# Altium footprint library My Library.PcbLib: 872 footprints (part 54 of 55)
Each footprint in its own frame and in the unit in brackets; x right, y up, seen from the top. Pads: shape width x height; smd on the part's side, far side on the other; paste and mask are expansions set on the pad; w line width, h text height; cw(c..) or ccw(c..) is an arc to the next point about the centre after c.
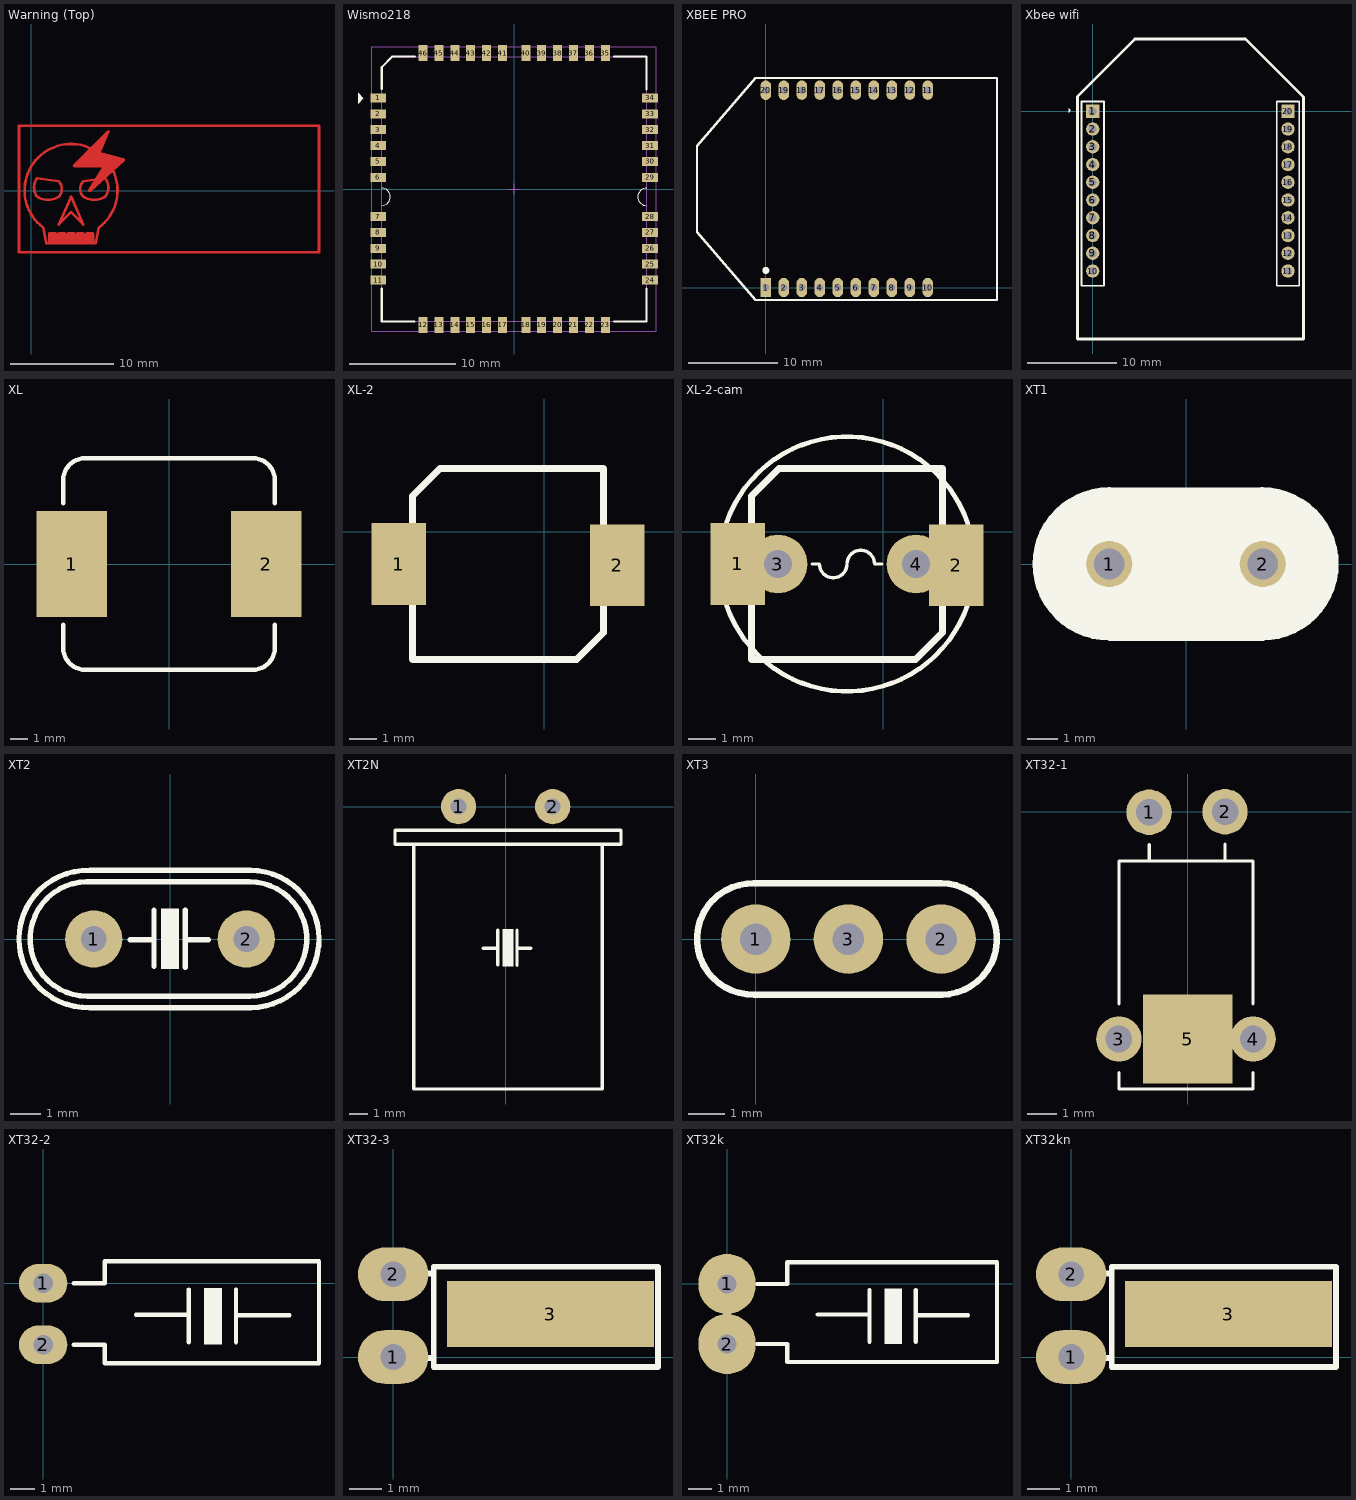
[diagram p53: the footprints below, top view; thin cyan lines are the x and y axes]

## Warning (Top) [mm]
Top Layer:
  region: 4.253,-4.105 4.293,-4.202 4.293,-5.102 4.253,-5.2 4.156,-5.24 3.556,-5.24 3.459,-5.2 3.419,-5.102 3.419,-4.202 3.459,-4.105 3.556,-4.065 4.156,-4.065
  region: 3.353,-4.105 3.393,-4.202 3.393,-5.102 3.353,-5.2 3.255,-5.24 2.655,-5.24 2.558,-5.2 2.518,-5.102 2.518,-4.202 2.558,-4.105 2.655,-4.065 3.255,-4.065
  region: 6.054,-4.105 6.094,-4.202 6.094,-5.102 6.054,-5.2 5.957,-5.24 5.356,-5.24 5.259,-5.2 5.219,-5.102 5.219,-4.202 5.259,-4.105 5.356,-4.065 5.957,-4.065
  region: 5.153,-4.105 5.194,-4.202 5.194,-5.102 5.153,-5.2 5.056,-5.24 4.456,-5.24 4.359,-5.2 4.319,-5.102 4.319,-4.202 4.359,-4.105 4.456,-4.065 5.056,-4.065
  region: 2.452,-4.105 2.492,-4.202 2.492,-5.102 2.452,-5.2 2.355,-5.24 1.755,-5.24 1.658,-5.2 1.617,-5.102 1.617,-4.202 1.658,-4.105 1.755,-4.065 2.355,-4.065
  region: 7.483,5.829 7.512,5.829 7.53,5.81 7.555,5.8 7.565,5.774 7.585,5.754 7.585,5.727 7.595,5.703 7.584,5.677 7.584,5.649 6.747,3.696 8.991,3.135 9.024,3.111 9.06,3.094 9.065,3.081 9.076,3.073 9.082,3.033 9.095,2.995 9.089,2.983 9.092,2.969 9.068,2.936 9.051,2.9 5.749,-0.102 5.716,-0.114 5.687,-0.134 5.668,-0.131 5.65,-0.137 5.618,-0.122 5.584,-0.117 5.572,-0.101 5.555,-0.092 5.543,-0.059 5.523,-0.031 5.526,-0.012 5.519,0.007 5.534,0.038 5.54,0.073 6.909,2.264 4.156,2.264 4.059,2.304 4.018,2.401 4.059,2.498 7.36,5.8 7.386,5.811 7.406,5.83 7.433,5.83 7.457,5.84
  lines w0.254: -1.201,-6.003 -1.201,6.303 27.94,6.303 27.94,-6.003 -1.201,-6.003 ; 0.554,-0.6 ccw(c1.604,1.05) 2.655,-0.6 ccw(c1.905,0.15) 2.655,0.9 0.554,1.201 ccw(c1.755,0.3) 0.554,-0.6 ; 1.154,-3.602 cw(c3.856,0.014) 6.557,-3.602 6.257,-5.102 1.455,-5.102 1.154,-3.602 ; 2.655,-3.302 3.856,-0.6 5.056,-3.302 3.856,-2.101 2.655,-3.302 ; 4.156,2.401 7.457,5.703 6.557,3.602 8.958,3.002 5.657,0 7.157,2.401 4.156,2.401 ; 5.056,-0.6 cw(c5.806,0.15) 5.056,0.9 7.157,1.201 cw(c6.107,0.3) 7.157,-0.6 cw(c6.107,1.05) 5.056,-0.6
  text "NGUY HIÓM" at 9.271,1.524 h4
  text "§iÖn ¸p cao" at 11.303,-2.921 h3

## Wismo218 [mm] "LCC, 46-Pins, Body 25,0x25,0mm (max), Wismo218"
height 2.8
pads (46):
  rect 1.5x0.85 smd: 1(-12.825,8.6) 2(-12.825,7.1) 3(-12.825,5.6) 4(-12.825,4.1) 5(-12.825,2.6) 6(-12.825,1.1) 7(-12.825,-2.6) 8(-12.825,-4.1) 9(-12.825,-5.6) 10(-12.825,-7.1) 11(-12.825,-8.6) 24(12.825,-8.6) 25(12.825,-7.1) 26(12.825,-5.6) 27(12.825,-4.1) 28(12.825,-2.6) 29(12.825,1.1) 30(12.825,2.6) 31(12.825,4.1) 32(12.825,5.6) 33(12.825,7.1) 34(12.825,8.6)
  rect 0.85x1.5 smd: 12(-8.6,-12.825) 13(-7.1,-12.825) 14(-5.6,-12.825) 15(-4.1,-12.825) 16(-2.6,-12.825) 17(-1.1,-12.825) 18(1.1,-12.825) 19(2.6,-12.825) 20(4.1,-12.825) 21(5.6,-12.825) 22(7.1,-12.825) 23(8.6,-12.825) 35(8.6,12.825) 36(7.1,12.825) 37(5.6,12.825) 38(4.1,12.825) 39(2.6,12.825) 40(1.1,12.825) 41(-1.1,12.825) 42(-2.6,12.825) 43(-4.1,12.825) 44(-5.6,12.825) 45(-7.1,12.825) 46(-8.6,12.825)
Top Overlay:
  region: -14.737,8.047 -14.229,8.555 -14.737,9.063
  lines w0.1: -12.498,-1.559 ccw(c-12.498,-0.739) -12.482,0.081 ; 12.474,-1.567 cw(c12.49,-0.747) 12.49,0.073
  lines w0.2: -12.5,-12.5 -12.5,-9.407 ; -12.5,9.463 -12.5,11.5 -11.5,12.5 -9.371,12.5 ; -12.498,-12.505 -9.405,-12.505 ; 9.407,-12.5 12.5,-12.5 ; 9.407,12.5 12.5,12.5 ; 12.502,9.402 12.502,12.495 ; 12.505,-12.498 12.505,-9.405
Mechanical 13:
  lines w0.1: -12.5,-12.5 -12.5,11.5 -11.5,12.5 12.5,12.5 12.5,-12.5 -12.5,-12.5
Mechanical 15:
  lines w0.1: -0.5,0 0.5,0 ; 0,-0.5 0,0.5 ; -13.425,-13.425 13.425,-13.425 13.425,13.425 -13.425,13.425 -13.425,-13.425
3D body: height 0.9, standoff 0, extent -12.5,-12.5 12.5,12.5
3D body: height 2.8, standoff 0.8, extent -11.44,-11.428 11.438,11.394

## XBEE PRO [mil]
pads (20):
  rect 47.24x85 hole 31: 1(0,0)
  oval 47.24x85 hole 31: 2(79,0) 3(158,0) 4(237,0) 5(316,0) 6(395,0) 7(474,0) 8(553,0) 9(632,0) 10(711,0) 11(711,866.14) 12(632,866.14) 13(553,866.14) 14(474,866.14) 15(395,866.14) 16(316,866.14) 17(237,866.14) 18(158,866.14) 19(79,866) 20(0,866)
Top Overlay:
  circle w15: c0,75 r8
  lines w10: -302,244 -302,621 -45,920 1015,920 1015,-55 -45,-55 -302,244
3D body "User Library-SMA Antenna.STEP": height 3463.28, standoff 39.37, extent -1733.27,245 -516.73,638.7
3D body "SparkFun Electronics-WRL_10419.STEP": height 423.14, standoff -12.15, extent -812,-47 1008,913

## Xbee wifi [mm] "Connector; Header; 10 Position"
pads (20):
  rect 1.5x1.5 hole 0.9: 1(0,0) 20(22,0)
  round 1.5 hole 0.9: 2(0,-2) 3(0,-4) 4(0,-6) 5(0,-8) 6(0,-10) 7(0,-12) 8(0,-14) 9(0,-16) 10(0,-18) 11(22,-18) 12(22,-16) 13(22,-14) 14(22,-12) 15(22,-10) 16(22,-8) 17(22,-6) 18(22,-4) 19(22,-2)
Top Overlay:
  region: -2.73,-0.14 -2.73,0.368 -2.451,0.14
  lines w0.2: -1.27,-19.67 -1.27,1.12 1.27,1.12 1.27,-0.635 1.27,-19.67 -1.27,-19.67 ; 20.73,-19.67 23.27,-19.67 23.27,-0.635 23.27,1.12 20.73,1.12 20.73,-19.67
  lines w0.3: -1.726,-25.659 23.75,-25.659 23.75,1.596 17.197,8.149 4.751,8.149 -1.726,1.672 -1.726,-25.659
3D body: height 4, standoff 1, extent 20.73,-19.67 23.27,1.12
3D body: height 4, standoff 1, extent -1.27,-19.67 1.27,1.12
3D body: height 4, standoff 2.5, extent 1.6,-19.787 20.472,1.118
3D body: height 5, standoff 4, extent -1.726,-25.659 23.75,8.306

## XL [mm]
pads (2):
  rect 4x6 smd: 1(-5.5,0) 2(5.5,0)
Top Overlay:
  lines w0.254: -6,-3.429 -6,-4.73 ccw(c-4.73,-4.73) -4.73,-6 4.73,-6 ccw(c4.73,-4.73) 6,-4.73 6,-3.429 ; -6,3.429 -6,4.73 cw(c-4.73,4.73) -4.73,6 4.73,6 cw(c4.73,4.73) 6,4.73 6,3.429
3D body: height 4, standoff 0, extent -6.299,-2.997 -5.791,2.997
3D body: height 4, standoff 0, extent 5.791,-2.997 6.299,2.997
3D body: height 8, standoff 0, extent -5.994,-6.02 6.02,5.994

## XL-2 [mm]
pads (2):
  rect 2x3 smd: 1(-5.351,-1.181) 2(2.684,-1.219)
Top Overlay:
  lines w0.254: -4.851,-4.699 -4.851,1.321 -3.835,2.337 2.184,2.337 2.184,-3.708 1.194,-4.699 -4.851,-4.699
3D body: height 2, standoff 0, extent 2.159,-2.553 2.438,0.14
3D body: height 2, standoff 0, extent -5.105,-2.515 -4.826,0.178
3D body: height 3.2, standoff 0, extent -4.851,-4.699 2.184,2.337

## XL-2-cam [mil]
pads (4):
  rect 78.74x118.11 smd: 1(-210.67,-46.5) 2(105.67,-48)
  round 85 hole 40: 3(-152.5,-46.5) 4(47.5,-46.5)
Top Overlay:
  circle w7: c-52.5,-46.5 r184.39
  lines w5: -102.5,-46.5 -92.5,-46.5 ccw(c-72.5,-46.5) -52.5,-46.5 cw(c-32.5,-46.5) -12.5,-46.5 -2.5,-46.5
  lines w10: -191,-185 47,-185 86,-146 86,92 -151,92 -191,52 -191,-185
3D body: height 125.98, standoff 0, extent -191,-185 86,92
3D body: height 78.74, standoff 0, extent -201,-99 -190,7
3D body: height 78.74, standoff 0, extent 85,-100.5 96,5.5

## XT1 [mil]
pads (2):
  round 60 hole 40: 1(-100,0) 2(100,0)
Top Overlay:
  region: -100,95.57 -118.62,93.74 -136.53,88.3 -153.03,79.48 -167.5,67.61 -179.37,53.15 -188.19,36.64 -193.63,18.73 -195.46,0.11 -195,0.11 -195.46,0 -193.63,-18.6 -188.2,-36.49 -179.39,-52.97 -167.53,-67.42 -153.08,-79.28 -136.6,-88.09 -118.71,-93.52 -100.11,-95.35 -100.11,-94.89 99.78,-94.87 99.95,-94.94 100.02,-95.11 100,-95.57 118.62,-93.74 136.53,-88.3 153.03,-79.48 167.5,-67.61 179.37,-53.15 188.19,-36.64 193.63,-18.73 195.46,-0.11 195,-0.11 195.46,0 193.63,18.6 188.2,36.49 179.39,52.97 167.53,67.42 153.08,79.28 136.6,88.09 118.71,93.52 100.11,95.35 100.11,94.89 100,94.89
  lines w10: -100,-94.89 cw(c-100,0.11) -100,95.11 ; -99,-95.11 100,-95.11 ; -99,94.89 100,94.89 ; 99,-94.89 ccw(c99,0.11) 99,95.11
3D body: height 118.11, standoff 27.56, extent -164.02,-65.13 165.02,64.91
3D body: height 31.5, standoff 19.68, extent -174.02,-75.13 175.02,74.91
3D body: height 19.68, standoff -19.68, extent -119.98,-19.98 -80.02,19.98
3D body: height 19.68, standoff -19.68, extent 80.02,-19.98 119.98,19.98

## XT2 [mil] "Footpin for Crystal 2 pin"
pads (2):
  round 75 hole 34: 1(-100,0) 2(100,0)
Top Overlay:
  region: 11.5,40 11.5,-39 -11.5,-39 -11.5,40
  lines w7: -109,75 ccw(c-108.5,0) -108.27,-75 ; -106.97,-75 103.03,-75 ; -105.97,75 104.03,75 ; -105.02,-90 105.91,-90 ccw(c105.31,0) 105.03,90 -104.97,90.01 ccw(c-108,0.06) -105.02,-89.89 ; -52,-1 -21,-1 ; -21,-36 -21,38 ; 20,-37 20,38 ; 20,-1 50,-1 ; 104,75 cw(c104.23,0) 104.73,-75
3D body "SW3dPS-HP49US.STEP": height 137.8, standoff -157.48, extent -233.43,-93.07 213.43,90

## XT2N [mil] "Crystal 2pin, high 200 mil"
height 200
pads (2):
  round 75 hole 34: 1(-100,0) 2(100,0)
Top Overlay:
  region: 16.5,-260 16.5,-339 -6.5,-339 -6.5,-260
  lines w7: -48,-301 -17,-301 ; -17,-336 -17,-262 ; 24,-337 24,-262 ; 24,-301 54,-301 ; -235,-80 -235,-50 ; -235,-80 -195,-80 ; -235,-80 -235,-50 ; -235,-80 -195,-80 ; -235,-50 245,-50 ; -235,-50 245,-50 ; -195,-600 205,-600 ; -195,-600 -195,-80 ; -195,-600 205,-600 ; -195,-600 -195,-80 ; -195,-80 205,-80 ; -195,-80 205,-80 ; 205,-600 205,-80 ; 205,-600 205,-80 ; 205,-80 245,-80 ; 205,-80 245,-80 ; 245,-80 245,-50 ; 245,-80 245,-50
3D body "SW3dPS-HC49U.STEP": height 91.44, standoff -92.52, extent -209.86,-594.33 230,14.33

## XT3 [mil] "Crystal 3pin, High 200mil, Cremic"
height 200
pads (3):
  round 75 hole 34: 1(0,0) 2(200,0) 3(100,0)
Top Overlay:
  lines w7: -2,60 198,60 ; -1.38,-59.91 cw(c-3.36,0.06) -1.35,60.02 ; 1,-60 201,-60 ; 200.13,60 cw(c200.31,0) 200.71,-60

## XT32-1 [mil] "Cryxtal 32.768kHz"
pads (5):
  round 60 hole 35: 1(-51.15,-0.65) 2(49,0) 3(-91,-300) 4(86,-300)
  rect 118.11x118.11 smd: 5(0,-300)
Top Overlay:
  lines w4: -91,-344 -91,-366 86,-366 86,-344 ; -91,-254 -91,-65 86,-65 86,-254 ; -51,-65 -51,-43 ; 49,-65 49,-43 ; 49.15,-64.35 49.15,-42.35
3D body: height 129.78, standoff -11.67, extent -70.76,-352.98 70.42,-57.7
3D body: height 68.88, standoff 49.23, extent -60.96,-59.7 -41.35,-0.65
3D body: height 68.9, standoff 49.21, extent -60.87,-9.87 -41.29,9.73
3D body: height 59.06, standoff 0, extent -60.87,-9.87 -41.23,9.73
3D body: height 59.06, standoff 0, extent 39.28,-9.22 58.93,10.38
3D body: height 68.9, standoff 49.21, extent 39.28,-9.22 58.86,10.38
3D body: height 68.88, standoff 49.23, extent 39.2,-59.06 58.8,0

## XT32-2 [mm] "Crystal 32k, 2 pin, real timer for DS1307"
height 3.81
pads (2):
  oval 2x1.6 hole 0.813: 1(0,0) 2(0,-2.54)
Top Overlay:
  rectangle: 6.655,-2.54 7.391,-0.203
  lines w0.178: 1.27,-2.54 2.54,-2.54 2.54,-3.302 11.405,-3.302 11.405,0.914 2.54,0.914 2.54,0 1.27,0 ; 3.835,-1.295 6.02,-1.295 ; 6.02,-2.438 6.02,-0.254 ; 7.976,-2.438 7.976,-0.254 ; 8.001,-1.321 10.185,-1.321
3D body "User Library-Crystal TH.STEP": height 3.4, standoff 0.2, extent 0.15,-2.866 10.925,0.584

## XT32-3 [mil] "Crystal for 32,768kHz, 2pin"
height 150
pads (3):
  oval 85x65 hole 31: 1(0,0) 2(0,100)
  rect 250x80 smd: 3(190,52)
Top Overlay:
  lines w7: 34,-1 49,-1 ; 35,101 49,101 ; 49,101 49,109 320,109 320,-12 49,-12 49,101
3D body: height 68.88, standoff 49.23, extent 0,90.2 59.06,109.8
3D body: height 68.9, standoff 49.21, extent -10.38,90.28 9.22,109.86
3D body: height 59.06, standoff 0, extent -10.38,90.28 9.22,109.93
3D body: height 59.06, standoff 0, extent -9.73,-9.87 9.87,9.77
3D body: height 68.9, standoff 49.21, extent -9.73,-9.87 9.87,9.71
3D body: height 68.88, standoff 49.23, extent 0.65,-9.96 59.7,9.65
3D body: height 129.78, standoff -11.67, extent 57.7,-19.76 352.98,121.42

## XT32k [mil] "Crystal 32k, 2 pin, real timer for DS1307"
height 150
pads (2):
  oval 95x100 hole 32: 1(0,0) 2(0,-100)
Top Overlay:
  rectangle: 262,-100 291,-8
  lines w7: 50,-100 100,-100 100,-130 449,-130 449,36 100,36 100,0 50,0 ; 151,-51 237,-51 ; 237,-96 237,-10 ; 314,-96 314,-10 ; 315,-52 401,-52

## XT32kn [mil] "Crystal for 32,768kHz, 2pin"
height 150
pads (3):
  oval 85x65 hole 31: 1(0,0) 2(0,100)
  rect 250x80 smd: 3(190,52)
Top Overlay:
  lines w7: 34,-1 49,-1 ; 35,101 49,101 ; 49,101 49,-12 320,-12 320,109 49,109 49,101